# Altium footprint library miniVent_PCB_v1_01.PcbLib: 32 footprints (part 2 of 2)
Each footprint in its own frame and in the unit in brackets; x right, y up, seen from the top. Pads: shape width x height; smd on the part's side, far side on the other; paste and mask are expansions set on the pad; w line width, h text height; cw(c..) or ccw(c..) is an arc to the next point about the centre after c.
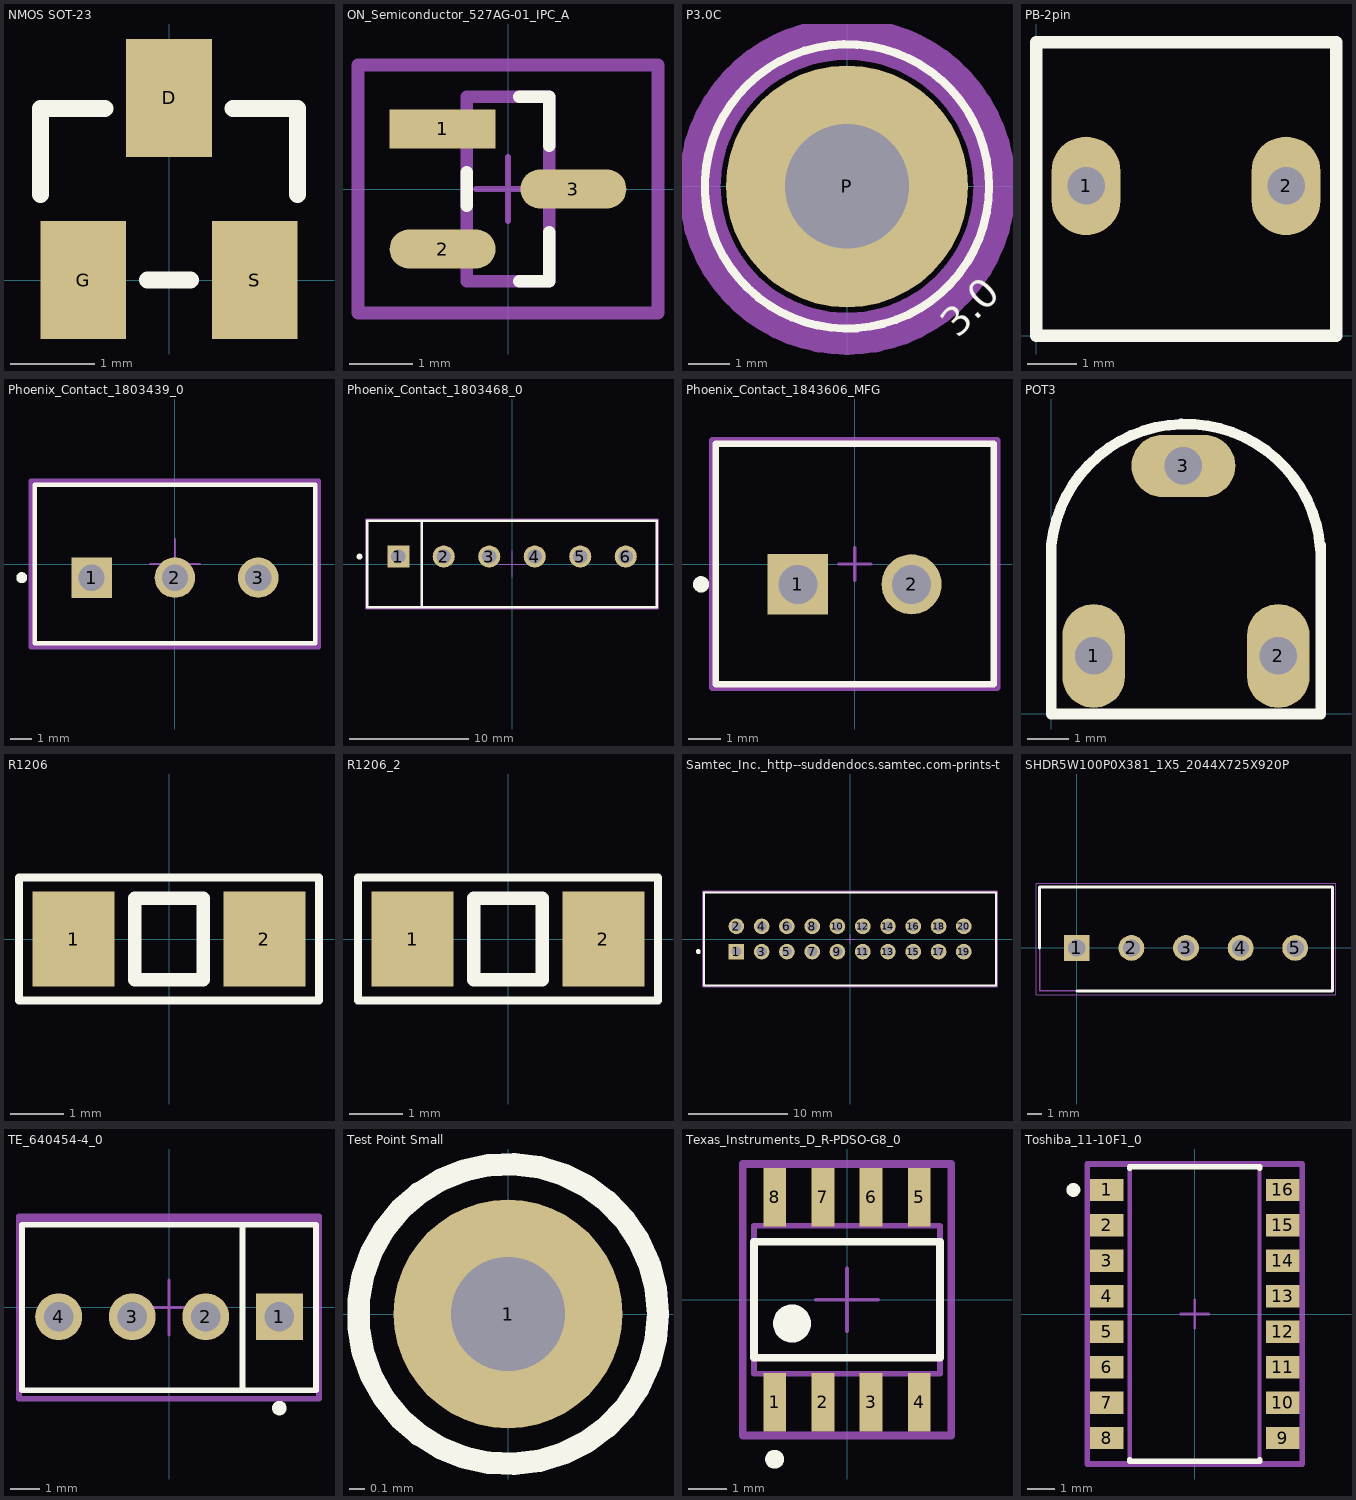
[diagram p1: the footprints below, top view; thin cyan lines are the x and y axes]

## NMOS SOT-23 [mil]
pads (3):
  rect 40x55 smd: D(0,85) G(-40,0) S(40,0)
Top Overlay:
  lines w8: -60,40 -60,80 -30,80 ; -10,0 10,0 ; 30,80 60,80 60,40

## ON_Semiconductor_527AG-01_IPC_A [mm]
pads (3):
  rect 1.675x0.618 smd paste+0 mask+0: 1(-1.035,0.95)
  rrect100% 1.675x0.618 smd paste+0 mask+0: 2(-1.035,-0.95) 3(1.035,0)
Top Overlay:
  lines w0.2: -0.65,-0.266 -0.65,0.266 ; 0.177,-1.46 0.65,-1.46 0.65,-0.684 ; 0.177,1.46 0.65,1.46 0.65,0.684
Mechanical 10:
  lines w0.2: -2.372,-1.96 -2.372,1.96 2.372,1.96 2.372,-1.96 -2.372,-1.96
  text ".Designator" at 0,0 h1
Mechanical 12:
  lines w0.2: -0.65,-1.46 -0.65,1.46 0.65,1.46 0.65,-1.46 -0.65,-1.46
Mechanical 15:
  lines w0.1: -0.5,0 0.5,0 ; 0,-0.5 0,0.5
  lines w0.2: -2.372,-1.96 -2.372,1.96 2.372,1.96 2.372,-1.96 -2.372,-1.96
3D body "Trans_ON_Semiconductor_FDN360P_eec.STEP": height 0.25, standoff 0, extent -2.372,-1.96 2.372,1.96

## P3.0C [mil]
pads (1):
  round 230 hole 118.11: P(0,0)
Top Overlay:
  circle w7.87: c0,0 r135
  text "3.0" at 105,-145 h27.56
Bottom Overlay:
  circle w7.87: c0,0 r135
Mechanical 1:
  circle w40: c0,0 r140

## PB-2pin [mil] "Switch"
height 236.22
pads (2):
  oval 55.12x78.74 hole 30: 1(40,120) 2(200,120)
Top Overlay:
  lines w10: 0,0 0,235 240,235 240,0 0,0

## Phoenix_Contact_1803439_0 [mm]
pads (3):
  rect 1.85x1.85 hole 1.2 paste-1000 mask+0: 1(-3.81,-0.625)
  round 1.85 hole 1.2 paste-1000 mask+0: 2(0,-0.625) 3(3.81,-0.625)
Top Overlay:
  circle w0.25: c-7,-0.625 r0.125
  lines w0.2: -6.41,-3.625 -6.41,3.625 6.41,3.625 6.41,-3.625 -6.41,-3.625
Mechanical 10:
  lines w0.2: -6.585,-3.8 -6.585,3.8 6.585,3.8 6.585,-3.8 -6.585,-3.8
  text ".Designator" at 0,0 h1
Mechanical 12:
  lines w0.15: -6.41,-3.625 -6.41,3.625 6.41,3.625 6.41,-3.625 -6.41,-3.625
Mechanical 15:
  lines w0.1: -1.14,0 1.14,0 ; 0,-1.14 0,1.14
  lines w0.2: -6.585,-3.8 -6.585,3.8 6.585,3.8 6.585,-3.8 -6.585,-3.8
3D body "1860650.stp": height 9.2, standoff -3.8, extent -6.283,-3.429 6.537,3.821

## Phoenix_Contact_1803468_0 [mm]
pads (6):
  rect 1.85x1.85 hole 1.2 paste-1000 mask+0: 1(-9.525,0.625)
  round 1.85 hole 1.2 paste-1000 mask+0: 2(-5.715,0.625) 3(-1.905,0.625) 4(1.905,0.625) 5(5.715,0.625) 6(9.525,0.625)
Top Overlay:
  circle w0.25: c-12.775,0.625 r0.125
  lines w0.2: -7.575,-3.625 -7.575,3.625 ; -12.125,-3.625 -12.125,3.625 12.125,3.625 12.125,-3.625 -12.125,-3.625
Mechanical 10:
  lines w0.2: -12.225,-3.725 -12.225,3.725 12.225,3.725 12.225,-3.725 -12.225,-3.725
  text ".Designator" at 0,0 h1
Mechanical 12:
  lines w0.15: -12.125,-3.625 -12.125,3.625 12.125,3.625 12.125,-3.625 -12.125,-3.625
Mechanical 15:
  lines w0.1: -1.118,0 1.118,0 ; 0,-1.118 0,1.118
  lines w0.2: -12.225,-3.725 -12.225,3.725 12.225,3.725 12.225,-3.725 -12.225,-3.725
3D body "1860689.stp": height 9.2, standoff -3.8, extent -12.125,-3.81 12.125,3.44

## Phoenix_Contact_1843606_MFG [mm]
pads (2):
  rect 1.85x1.85 hole 1.2 paste-1000 mask+0: 1(-1.75,-0.625)
  round 1.85 hole 1.2 paste-1000 mask+0: 2(1.75,-0.625)
Top Overlay:
  circle w0.25: c-4.725,-0.625 r0.125
  lines w0.2: -4.275,-3.7 -4.275,3.7 4.275,3.7 4.275,-3.7 -4.275,-3.7
Mechanical 10:
  lines w0.2: -4.375,-3.8 -4.375,3.8 4.375,3.8 4.375,-3.8 -4.375,-3.8
  text ".Designator" at 0,0 h1
Mechanical 12:
  lines w0.15: -4.275,-3.7 -4.275,3.7 4.275,3.7 4.275,-3.7 -4.275,-3.7
Mechanical 15:
  lines w0.1: -0.5,0 0.5,0 ; 0,-0.5 0,0.5
  lines w0.2: -4.375,-3.8 -4.375,3.8 4.375,3.8 4.375,-3.8 -4.375,-3.8
3D body "Conn_Phoenix_Contact_1843606_eec.STEP": height 0.25, standoff 0, extent -4.375,-3.8 4.375,3.8

## POT3 [mm]
pads (3):
  oval 1.5x2.5 hole 0.9: 1(1.016,1.397) 2(5.461,1.397)
  oval 2.5x1.5 hole 0.9: 3(3.175,5.969)
Top Overlay:
  lines w0.254: 6.474,3.961 ccw(c3.233,3.73) 0,4.064 0,0 6.477,0 6.477,4.064

## R1206 [mil]
pads (2):
  rect 60x70 smd: 1(-70,0) 2(70,0)
Top Overlay:
  lines w5.91: -110,-45 110,-45 110,45 -110,45 -110,-45
  lines w10: -25,-30 25,-30 25,30 -25,30 -25,-30
3D body "User Library-R_1206.step": height 23.62, standoff 0, extent -64.17,-31.1 61.81,31.89

## R1206_2 [mil]
pads (2):
  rect 60x70 smd: 1(-70,0) 2(70,0)
Top Overlay:
  lines w5.91: -110,-45 -110,45 110,45 110,-45 -110,-45
  lines w10: -25,-30 -25,30 25,30 25,-30 -25,-30
3D body "User Library-R_1206.step": height 23.62, standoff 0, extent -64.17,-31.1 61.81,31.89

## Samtec_Inc._http--suddendocs.samtec.com-prints-tss-tstd.pdf_0 [mm]
pads (20):
  rect 1.57x1.57 hole 1.02 paste-1000 mask+0: 1(-11.43,-1.27)
  round 1.57 hole 1.02 paste-1000 mask+0: 2(-11.43,1.27) 3(-8.89,-1.27) 4(-8.89,1.27) 5(-6.35,-1.27) 6(-6.35,1.27) 7(-3.81,-1.27) 8(-3.81,1.27) 9(-1.27,-1.27) 10(-1.27,1.27) 11(1.27,-1.27) 12(1.27,1.27) 13(3.81,-1.27) 14(3.81,1.27) 15(6.35,-1.27) 16(6.35,1.27) 17(8.89,-1.27) 18(8.89,1.27) 19(11.43,-1.27) 20(11.43,1.27)
Top Overlay:
  circle w0.25: c-15.27,-1.27 r0.125
  lines w0.2: -14.67,-4.7 14.67,-4.7 14.67,4.7 -14.67,4.7 -14.67,-4.7
Mechanical 10:
  lines w0.2: -14.77,-4.8 14.77,-4.8 14.77,4.8 -14.77,4.8 -14.77,-4.8
  text ".Designator" at 0,0 h1
Mechanical 12:
  lines w0.15: -14.67,-4.7 14.67,-4.7 14.67,4.7 -14.67,4.7 -14.67,-4.7
Mechanical 15:
  lines w0.1: -0.5,0 0.5,0 ; 0,-0.5 0,0.5
  lines w0.2: -14.77,-4.8 14.77,-4.8 14.77,4.8 -14.77,4.8 -14.77,-4.8
3D body "Conn_Samtec_Inc._TSS-110-01-G-D_eec.STEP": height 9.35, standoff -2.84, extent -14.605,-4.47 14.605,4.801

## SHDR5W100P0X381_1X5_2044X725X920P [mm]
pads (5):
  rect 1.8x1.8 hole 1.2: 1(0,0)
  round 1.8 hole 1.2: 2(3.81,0) 3(7.62,0) 4(11.43,0) 5(15.24,0)
Top Overlay:
  lines w0.2: -2.6,0 -2.6,4.25 17.84,4.25 17.84,-3 0,-3
Mechanical 13:
  lines w0.1: -2.6,-3 -2.6,4.25 17.84,4.25 17.84,-3 -2.6,-3
Mechanical 15:
  lines w0.05: -2.85,-3.25 -2.85,4.5 18.09,4.5 18.09,-3.25 -2.85,-3.25
3D body "1803455.stp": height 9.2, standoff -3.4, extent -2.6,-3.048 17.84,4.202

## TE_640454-4_0 [mm]
pads (4):
  rect 1.62x1.62 hole 1.02: 1(3.81,-0.32)
  round 1.62 hole 1.02: 2(1.27,-0.32) 3(-1.27,-0.32) 4(-3.81,-0.32)
Top Overlay:
  circle w0.25: c3.81,-3.475 r0.125
  lines w0.2: 2.54,-2.86 2.54,2.86 ; -5.08,-2.86 5.08,-2.86 5.08,2.86 -5.08,2.86 -5.08,-2.86
Mechanical 10:
  lines w0.2: -5.18,-3.15 5.18,-3.15 5.18,3.15 -5.18,3.15 -5.18,-3.15
  text ".Designator" at 0,0 h1
Mechanical 12:
  lines w0.15: -5.18,2.98 5.18,2.98 ; -5.08,-2.86 5.08,-2.86 5.08,2.86 -5.08,2.86 -5.08,-2.86
Mechanical 15:
  lines w0.1: -0.945,0 0.945,0 ; 0,-0.945 0,0.945
  lines w0.2: -5.18,-3.15 5.18,-3.15 5.18,3.15 -5.18,3.15 -5.18,-3.15
3D body "3dmodel.step": height 0.25, standoff 0, extent -5.18,-3.15 5.18,3.15

## Test Point Small [mil]
pads (1):
  round 60 hole 30: 1(0,0)
Top Overlay:
  circle w5.91: c0,0 r39.37
3D body "SW3DPS-TEST POINT-DEFAULT.step": height 255.91, standoff -118.11, extent -19.68,-19.69 19.69,19.69

## Texas_Instruments_D_R-PDSO-G8_0 [mm]
pads (8):
  rect 0.6x1.55 smd: 1(-1.905,-2.7) 2(-0.635,-2.7) 3(0.635,-2.7) 4(1.905,-2.7) 5(1.905,2.7) 6(0.635,2.7) 7(-0.635,2.7) 8(-1.905,2.7)
Top Overlay:
  circle w0.5: c-1.45,-0.625 r0.25
  circle w0.25: c-1.905,-4.2 r0.125
  lines w0.2: -2.45,-1.525 2.45,-1.525 2.45,1.525 -2.45,1.525 -2.45,-1.525
Top Paste:
  rectangle: -2.18,1.95 -1.63,3.45
  rectangle: -2.18,-3.45 -1.63,-1.95
  rectangle: 1.63,-3.45 2.18,-1.95
  rectangle: 1.63,1.95 2.18,3.45
  rectangle: 0.36,1.95 0.91,3.45
  rectangle: -0.91,1.95 -0.36,3.45
  rectangle: -0.91,-3.45 -0.36,-1.95
  rectangle: 0.36,-3.45 0.91,-1.95
Mechanical 10:
  lines w0.2: -2.75,-3.575 2.75,-3.575 2.75,3.575 -2.75,3.575 -2.75,-3.575
  text ".Designator" at 0,0 h1
Mechanical 12:
  lines w0.15: -2.45,-1.95 2.45,-1.95 2.45,1.95 -2.45,1.95 -2.45,-1.95
Mechanical 15:
  lines w0.1: -0.825,0 0.825,0 ; -0.5,0 0.5,0 ; 0,-0.825 0,0.825 ; 0,-0.5 0,0.5
  lines w0.2: -2.75,-3.575 2.75,-3.575 2.75,3.575 -2.75,3.575 -2.75,-3.575
3D body "3dmodel.step": height 0.25, standoff 0, extent -2.75,-3.575 2.75,3.575

## Toshiba_11-10F1_0 [mm]
pads (16):
  rect 1.2x0.8 smd: 1(-3.15,4.445) 2(-3.15,3.175) 3(-3.15,1.905) 4(-3.15,0.635) 5(-3.15,-0.635) 6(-3.15,-1.905) 7(-3.15,-3.175) 8(-3.15,-4.445) 9(3.15,-4.445) 10(3.15,-3.175) 11(3.15,-1.905) 12(3.15,-0.635) 13(3.15,0.635) 14(3.15,1.905) 15(3.15,3.175) 16(3.15,4.445)
Top Overlay:
  circle w0.25: c-4.35,4.445 r0.125
  lines w0.2: -2.325,-5.22 -2.325,-5.275 2.325,-5.275 2.325,-5.22 ; -2.325,5.22 -2.325,5.275 2.325,5.275 2.325,5.22
Mechanical 10:
  lines w0.2: -3.85,-5.375 -3.85,5.375 3.85,5.375 3.85,-5.375 -3.85,-5.375
  text ".Designator" at 0,0 h1
Mechanical 12:
  lines w0.15: -2.325,-5.275 -2.325,5.275 2.325,5.275 2.325,-5.275 -2.325,-5.275
Mechanical 15:
  lines w0.1: -0.5,0 0.5,0 ; 0,-0.5 0,0.5
  lines w0.2: -3.85,-5.375 -3.85,5.375 3.85,5.375 3.85,-5.375 -3.85,-5.375
3D body "Trans_Toshiba_TLP281-4_GB-TP,J,F_eec.STEP": height 0.25, standoff 0, extent -3.85,-5.375 3.85,5.375